# Altium footprint library IDETEC.PcbLib: 275 footprints (part 7 of 18)
Each footprint in its own frame and in the unit in brackets; x right, y up, seen from the top. Pads: shape width x height; smd on the part's side, far side on the other; paste and mask are expansions set on the pad; w line width, h text height; cw(c..) or ccw(c..) is an arc to the next point about the centre after c.
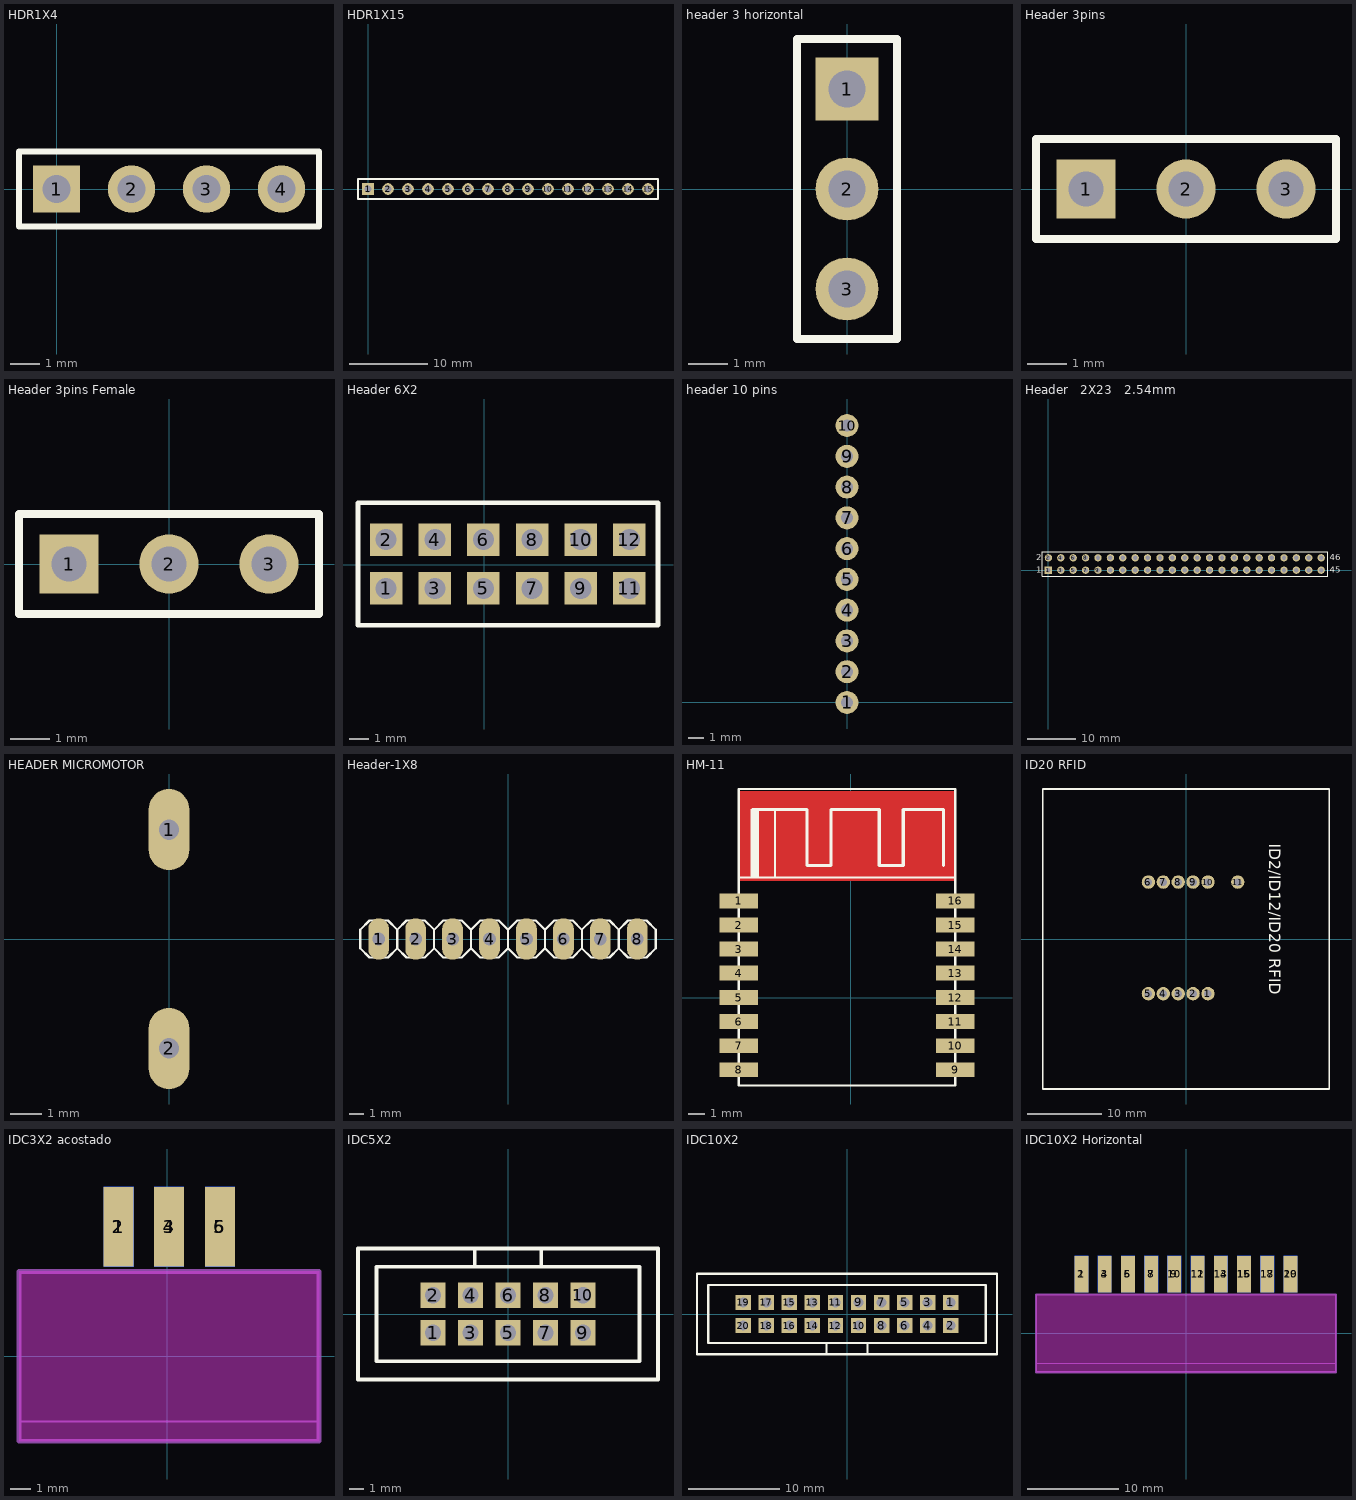
[diagram p6: the footprints below, top view; thin cyan lines are the x and y axes]

## HDR1X4 [mm] "Connector; Header; 4 Position"
height 2
pads (4):
  rect 1.6x1.6 hole 0.95: 1(0,0)
  round 1.6 hole 0.95: 2(2.54,0) 3(5.08,0) 4(7.62,0)
Top Overlay:
  lines w0.2: -1.27,-1.27 -1.27,1.27 8.89,1.27 8.89,-1.27 -1.27,-1.27
3D body "User Library-Header_Male_4Pin.STEP": height 8.54, standoff -3, extent -1.27,-1.245 8.89,1.245

## HDR1X15 [mm] "Connector; Header; 15 Position"
height 5
pads (15):
  rect 1.5x1.5 hole 0.9: 1(0,0)
  round 1.5 hole 0.9: 2(2.54,0) 3(5.08,0) 4(7.62,0) 5(10.16,0) 6(12.7,0) 7(15.24,0) 8(17.78,0) 9(20.32,0) 10(22.86,0) 11(25.4,0) 12(27.94,0) 13(30.48,0) 14(33.02,0) 15(35.56,0)
Top Overlay:
  lines w0.2: -1.27,-1.27 -1.27,1.27 0.635,1.27 36.83,1.27 36.83,-1.27 -1.27,-1.27

## header 3 horizontal [mm] "espadin horizontales de 3 pines"
height 2.54
pads (3):
  rect 1.6x1.6 hole 0.95 paste+0: 1(0,2.54)
  round 1.6 hole 0.95 paste+0: 2(0,0) 3(0,-2.54)
Top Overlay:
  lines w0.2: -1.27,-3.81 -1.27,3.81 1.27,3.81 1.27,-3.81 -1.27,-3.81
3D body "User Library-Header_Male_RA_Low_3Pin.STEP": height 2.51, standoff -3, extent -9.81,-3.81 0.32,3.81

## Header 3pins [mm] "header 5mm 2.54mm"
height 5
pads (3):
  rect 1.5x1.5 hole 0.9: 1(-2.54,0)
  round 1.5 hole 0.9: 2(0,0) 3(2.54,0)
Top Overlay:
  lines w0.2: -3.81,-1.27 -3.81,1.27 3.81,1.27 3.81,-1.27 -3.81,-1.27
3D body "User Library-Header_Male_3Pin.STEP": height 8.54, standoff -3, extent -3.81,-1.245 3.81,1.245

## Header 3pins Female [mm] "header 5mm 2.54mm"
height 5
pads (3):
  rect 1.5x1.5 hole 0.9: 1(-2.54,0)
  round 1.5 hole 0.9: 2(0,0) 3(2.54,0)
Top Overlay:
  lines w0.2: -3.81,-1.27 -3.81,1.27 3.81,1.27 3.81,-1.27 -3.81,-1.27
3D body "User Library-ZL262-3SG.STEP": height 8.4, standoff -3.15, extent -3.81,-1.23 3.81,1.27

## Header 6X2 [mm] "2.54mm header 12 pines"
height 6
pads (12):
  rect 1.7x1.7 hole 1.1: 1(-5.115,-1.24) 2(-5.115,1.3) 3(-2.575,-1.24) 4(-2.575,1.3) 5(-0.035,-1.24) 6(-0.035,1.3) 7(2.505,-1.24) 8(2.505,1.3) 9(5.045,-1.24) 10(5.045,1.3) 11(7.585,-1.24) 12(7.585,1.3)
Top Overlay:
  lines w0.254: -6.585,-3.165 -6.58,-3.17 9.08,-3.17 9.08,3.23 2.215,3.23 -2.285,3.23 -6.585,3.23 -6.585,-3.165
3D body "pin_header_awl254-dg-g12d.stp": height 8.5, standoff -3, extent -6.39,-2.49 8.85,2.59

## header 10 pins [mm] "headere de 1.7mm"
height 2.54
pads (10):
  round 1.5 hole 0.8: 1(0,0) 2(0,2) 3(0,4) 4(0,6) 5(0,8) 6(0,10) 7(0,12) 8(0,14) 9(0,16) 10(0,18)
3D body "29918.stp": height 5.5, standoff -2.9, extent -1.025,-0.95 0.975,3.05
3D body "29920.stp": height 5.5, standoff -2.9, extent -1.025,3.05 0.975,11.05
3D body "29920.stp": height 5.5, standoff -2.9, extent -1.025,11.025 0.975,19.025

## Header   2X23   2.54mm [mm] "Connector; Header; 22x2 Position"
height 6
pads (46):
  rect 1.5x1.5 hole 0.9: 1(0,0)
  round 1.5 hole 0.9: 2(0,2.54) 3(2.54,0) 4(2.54,2.54) 5(5.08,0) 6(5.08,2.54) 7(7.62,0) 8(7.62,2.54) 9(10.16,0) 10(10.16,2.54) 11(12.7,0) 12(12.7,2.54) 13(15.24,0) 14(15.24,2.54) 15(17.78,0) 16(17.78,2.54) 17(20.32,0) 18(20.32,2.54) 19(22.86,0) 20(22.86,2.54) 21(25.4,0) 22(25.4,2.54) 23(27.94,0) 24(27.94,2.54) 25(30.48,0) 26(30.48,2.54) 27(33.02,0) 28(33.02,2.54) 29(35.56,0) 30(35.56,2.54) 31(38.1,0) 32(38.1,2.54) 33(40.64,0) 34(40.64,2.54) 35(43.18,0) 36(43.18,2.54) 37(45.72,0) 38(45.72,2.54) 39(48.26,0) 40(48.26,2.54) 41(50.8,0) 42(50.8,2.54) 43(53.34,0) 44(53.34,2.54) 45(55.88,0) 46(55.88,2.54)
Top Overlay:
  lines w0.2: -1.27,-1.27 57.228,-1.27 57.228,3.81 -1.27,3.81 -1.27,-1.27
  text "2" at -2.54,2.032 h1.27
  text "1" at -2.54,-0.508 h1.27
  text "46" at 57.65,2.032 h1.27
  text "45" at 57.65,-0.508 h1.27
3D body "User Library-Header_Male_10Pin.STEP": height 3, standoff -8.54, extent -1.27,1.295 24.13,3.785
3D body "User Library-Header_Male_10Pin.STEP": height 3, standoff -8.54, extent -1.27,-1.245 24.13,1.245
3D body "User Library-Header_Male_10Pin.STEP": height 3, standoff -8.54, extent 24.13,1.295 49.53,3.785
3D body "User Library-Header_Male_10Pin.STEP": height 3, standoff -8.54, extent 24.13,-1.245 49.53,1.245
3D body "User Library-Header_Male_3Pin.STEP": height 3, standoff -8.54, extent 49.53,1.295 57.15,3.785
3D body "User Library-Header_Male_3Pin.STEP": height 3, standoff -8.54, extent 49.53,-1.245 57.15,1.245

## HEADER MICROMOTOR [mm] "HEADER MICROMOTOR"
height 2.54
pads (2):
  oval 1.3x2.6 hole 0.65: 1(0,3.5) 2(0,-3.5)

## Header-1X8 [mil] "Header Bar 1x8 pins"
pads (8):
  oval 56x112 hole 34: 1(-350,0) 2(-250,0) 3(-150,0) 4(-50,0) 5(50,0) 6(150,0) 7(250,0) 8(350,0)
Top Overlay:
  lines w6: -300,-25 -275,-50 -225,-50 -200,-25 ; -300,-25 -325,-50 -375,-50 -400,-25 -400,25 -375,50 -325,50 -300,25 ; -300,-25 -300,25 ; -300,25 -275,50 -225,50 -200,25 ; -200,-25 -200,25 ; -200,-25 -175,-50 -125,-50 -100,-25 ; -200,25 -175,50 -125,50 -100,25 ; -100,-25 -75,-50 -25,-50 0,-25 ; -100,-25 -100,25 ; -100,25 -75,50 -25,50 0,25 ; 0,-25 25,-50 75,-50 100,-25 ; 0,-25 0,25 ; 0,25 25,50 75,50 100,25 ; 100,-25 100,25 ; 100,-25 125,-50 175,-50 200,-25 ; 100,25 125,50 175,50 200,25 ; 200,-25 225,-50 275,-50 300,-25 ; 200,-25 200,25 ; 200,25 225,50 275,50 300,25 ; 300,-25 325,-50 375,-50 400,-25 400,25 375,50 325,50 300,25 ; 300,-25 300,25
Mechanical 16:
  rectangle: -360,-10 -340,10
  rectangle: -260,-10 -240,10
  rectangle: -160,-10 -140,10
  rectangle: -60,-10 -40,10
  rectangle: 40,-10 60,10
  rectangle: 140,-10 160,10
  rectangle: 240,-10 260,10
  rectangle: 340,-10 360,10

## HM-11 [mil] "HM-11"
pads (16):
  rect 95x36 smd: 1(-275.59,237) 2(-275.59,178) 3(-275.59,119) 4(-275.59,60) 5(-275.59,0) 6(-275.59,-59.06) 7(-275.59,-118.11) 8(-275.59,-177.17) 9(256,-177.17) 10(256,-118.11) 11(256,-59.06) 12(256,0) 13(256,60) 14(256,119) 15(256,178) 16(256,237)
Top Layer:
  rectangle: -272.05,286.57 254.09,507.4
Bottom Layer:
  rectangle: -272.05,286.57 254.09,507.4
Top Overlay:
  region: -245.79,461.88 -226.1,461.88 -226.1,294.88 -245.79,294.88
  lines w5: -275.31,294.88 -186.73,294.88 ; -186.73,461.88 -186.73,294.88 ; 256,294.88 -186.73,294.88 ; -275.59,-216.54 256,-216.54 256,512 -275.59,512 -275.59,-216.54
  lines w7.87: -241.73,461.88 -186.73,461.88 -107.99,461.88 -107.99,323.88 -48.94,323.88 -48.94,461.88 69.43,461.88 69.43,323.88 128.43,323.88 128.43,461.88 227.43,461.88 227.43,323.88
Mechanical 2:
  text "HM-11" at -255.91,434 h77.5
3D body "HM11.stp": height 66.93, standoff -3.94, extent -280.02,-211.78 251.48,516.56

## ID20 RFID [mm] "ID20 RFID"
pads (11):
  round 1.8 hole 1: 1(2.95,-7.35) 2(0.95,-7.35) 3(-1.05,-7.35) 4(-3.05,-7.35) 5(-5.05,-7.35) 6(-5.05,7.65) 7(-3.05,7.65) 8(-1.05,7.65) 9(0.95,7.65) 10(2.95,7.65) 11(6.95,7.65)
Top Overlay:
  lines w0.254: -19.25,-20.15 -19.25,20.15 19.25,20.15 19.25,-20.15 -19.25,-20.15
  text "ID2/ID12/ID20 RFID" at 11.176,12.827 h1.52

## IDC3X2 acostado [mm] "Conectir IDC acostado"
height 10
pads (6):
  rect 1.5x4 smd far side: 1(-2.425,6.475) 3(0.1,6.475) 5(2.65,6.475)
  rect 1.5x4 smd: 2(-2.43,6.475) 4(0.11,6.475) 6(2.65,6.475)
Keep-Out Layer:
  board cut-out: -7.4,-4.25 -7.4,4.24 7.6,4.24 7.6,-4.25
Mechanical 1:
  lines w0.1: -7.4,-3.25 7.575,-3.25
  lines w0.25: -7.4,-4.25 -7.4,4.24 7.6,4.24 7.6,-4.25 -7.4,-4.25
3D body "User Library-Header2x3-shrouded-vertical.STEP": height 4.97, standoff -4.47, extent -7.495,-4.35 7.745,7.85

## IDC5X2 [mm] "IDC5X2"
pads (10):
  rect 1.7x1.7 hole 1.1: 1(-5.08,-1.27) 2(-5.08,1.27) 3(-2.54,-1.27) 4(-2.54,1.27) 5(0,-1.27) 6(0,1.27) 7(2.54,-1.27) 8(2.54,1.27) 9(5.08,-1.27) 10(5.08,1.27)
Top Overlay:
  lines w0.254: -2.25,3.2 2.25,3.2 ; -2.25,3.2 -8.925,3.2 -8.925,-3.2 8.925,-3.2 8.925,3.2 2.25,3.2 ; -2.25,3.2 -2.25,4.45 ; -2.25,4.45 -10.175,4.45 -10.175,-4.45 10.175,-4.45 10.175,4.45 2.25,4.45 ; -2.25,4.45 2.25,4.45 ; 2.25,3.2 2.25,4.45
3D body "User Library-IDC-10MS.STEP": height 9.43, standoff -3.27, extent -10.214,-4.952 10.186,4.398

## IDC10X2 [mm] "IDC10X2"
pads (20):
  rect 1.7x1.7 hole 1.1: 1(11.43,1.27) 2(11.43,-1.27) 3(8.89,1.27) 4(8.89,-1.27) 5(6.35,1.27) 6(6.35,-1.27) 7(3.81,1.27) 8(3.81,-1.27) 9(1.27,1.27) 10(1.27,-1.27) 11(-1.27,1.27) 12(-1.27,-1.27) 13(-3.81,1.27) 14(-3.81,-1.27) 15(-6.35,1.27) 16(-6.35,-1.27) 17(-8.89,1.27) 18(-8.89,-1.27) 19(-11.43,1.27) 20(-11.43,-1.27)
Bottom Layer:
  text "20" at -13.208,-2.032 h1.52
  text "19" at -13.462,0.508 h1.52
  text "1" at 14.097,0.635 h1.52
  text "2" at 14.478,-2.032 h1.52
Top Overlay:
  lines w0.254: -2.25,-4.45 -2.25,-3.2 ; -2.25,-4.45 -16.525,-4.45 -16.525,4.45 16.525,4.45 16.525,-4.45 2.25,-4.45 ; -2.25,-4.45 2.25,-4.45 ; -2.25,-3.2 -15.275,-3.2 -15.275,3.2 15.275,3.2 15.275,-3.2 2.25,-3.2 ; -2.25,-3.2 2.25,-3.2 ; 2.25,-4.45 2.25,-3.2
3D body "User Library-idc-20_asm.STEP": height 9, standoff -3.2, extent -16.35,-4.25 16.35,4.25

## IDC10X2 Horizontal [mm] "IDC10X2 Horizontal"
pads (20):
  rect 1.5x4 smd far side: 1(-11.425,6.48) 3(-8.9,6.48) 5(-6.35,6.48) 7(-3.805,6.48) 9(-1.28,6.48) 11(1.27,6.48) 13(3.815,6.48) 15(6.34,6.48) 17(8.89,6.48) 19(11.435,6.48)
  rect 1.5x4 smd: 2(-11.43,6.48) 4(-8.89,6.48) 6(-6.35,6.48) 8(-3.81,6.48) 10(-1.27,6.48) 12(1.27,6.48) 14(3.81,6.48) 16(6.35,6.48) 18(8.89,6.48) 20(11.43,6.48)
Keep-Out Layer:
  board cut-out: -16.4,-4.245 -16.4,4.245 16.4,4.245 16.4,-4.245
Mechanical 1:
  lines w0.1: -16.4,-3.245 16.4,-3.245
  lines w0.25: -16.4,-4.245 -16.4,4.245 16.4,4.245 16.4,-4.245 -16.4,-4.245
3D body "User Library-idc-20_asm.STEP": height 4.22, standoff -4.28, extent -16.35,-4.245 16.35,7.955